# Altium integrated library Weidmueller_OMNIMATE_Signal.IntLib: 2550 symbols (part 12 of 45)
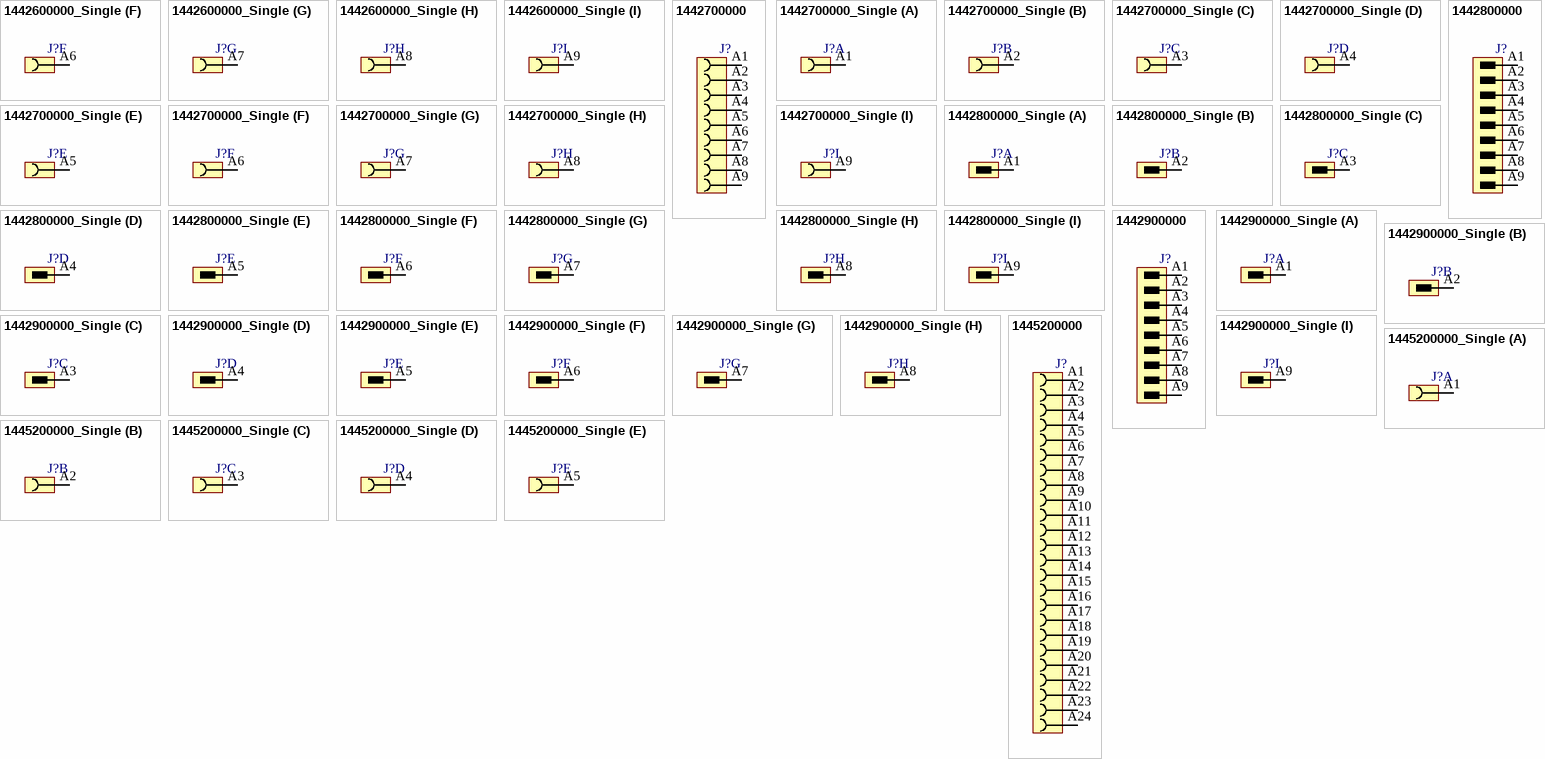
[diagram p222: symbols 1442600000_Single to 1445200000_Single]

## 1442700000
designator J?
OMNIMATE Signal - series RSV; PartNumber: 1442700000; Manufacturer: Weidmueller; Short_text_for_material: RSV1,6 LBF9 GR 3,2 SN; Pitch_mm: 5 mm; Pitch_inch: 0.197 inch; No_of_poles: 9; Solder_pin_length_mm: 3.2 mm; Contact_material: Cu-Leg; Contact_surface: tinned; Insulating_material: Wemid (PA); UL_94_flammability_rating: V-0; Rated_voltage_for_surge_voltage_class_pollution_degree_II_2: 500 V; Rated_current_min_no_of_poles_TU_20_deg_C: 32 A; PackageReference: RSV1_6_LBF_09; Colour: Pebble grey; Packaging: Box; Qty: 50 PCS; Revision: V1; ComponentLink1Description: Manufacturer URL; ComponentLink1URL: http://www.weidmueller.com/; ComponentLink2Description: URL Link1; ComponentLink2URL: http://catalog.weidmueller.com/catalog/Start.do?localeId=en&ObjectID=1442700000
footprint RSV1_6_LBF_09 (OMNIMATE Signal - Serie RSV  RSV1,6 LBF9 GR 3,2)
pins: A1, A2, A3, A4, A5, A6, A7, A8, A9

## 1442700000_Single
designator J?
OMNIMATE Signal - series RSV; PartNumber: 1442700000; Manufacturer: Weidmueller; Short_text_for_material: RSV1,6 LBF9 GR 3,2 SN; Pitch_mm: 5 mm; Pitch_inch: 0.197 inch; No_of_poles: 9; Solder_pin_length_mm: 3.2 mm; Contact_material: Cu-Leg; Contact_surface: tinned; Insulating_material: Wemid (PA); UL_94_flammability_rating: V-0; Rated_voltage_for_surge_voltage_class_pollution_degree_II_2: 500 V; Rated_current_min_no_of_poles_TU_20_deg_C: 32 A; PackageReference: RSV1_6_LBF_09; Colour: Pebble grey; Packaging: Box; Qty: 50 PCS; Revision: V1; ComponentLink1Description: Manufacturer URL; ComponentLink1URL: http://www.weidmueller.com/; ComponentLink2Description: URL Link1; ComponentLink2URL: http://catalog.weidmueller.com/catalog/Start.do?localeId=en&ObjectID=1442700000
footprint RSV1_6_LBF_09 (OMNIMATE Signal - Serie RSV  RSV1,6 LBF9 GR 3,2)
part A pins: A1
part B pins: A2
part C pins: A3
part D pins: A4
part E pins: A5
part F pins: A6
part G pins: A7
part H pins: A8
part I pins: A9

## 1442800000
designator J?
OMNIMATE Signal - series RSV; PartNumber: 1442800000; Manufacturer: Weidmueller; Short_text_for_material: RSV1,6 LSF9 GR 3,2 AU; Side_termination_characteristic: Flange; Mounting_onto_the_PCB: Solder connection; Pitch_mm: 5 mm; Pitch_inch: 0.197 inch; No_of_poles: 9; Outgoing_elbow: 180°; Solder_pin_length_mm: 3.2 mm; Contact_material: Cu-Leg; Contact_surface: Gold-plated; Insulating_material: Wemid (PA); UL_94_flammability_rating: V-0; Rated_voltage_for_surge_voltage_class_pollution_degree_II_2: 500 V; Rated_current_min_no_of_poles_TU_20_deg_C: 32 A; PackageReference: RSV1_6_LSF_09; Colour: Pebble grey; Packaging: Box; Qty: 50 PCS; Revision: V1; ComponentLink1Description: Manufacturer URL; ComponentLink1URL: http://www.weidmueller.com/; ComponentLink2Description: URL Link1; ComponentLink2URL: http://catalog.weidmueller.com/catalog/Start.do?localeId=en&ObjectID=1442800000
footprint RSV1_6_LSF_09 (OMNIMATE Signal - Serie RSV  RSV1,6 LSF9 GR 3,2)
pins: A1, A2, A3, A4, A5, A6, A7, A8, A9

## 1442800000_Single
designator J?
OMNIMATE Signal - series RSV; PartNumber: 1442800000; Manufacturer: Weidmueller; Short_text_for_material: RSV1,6 LSF9 GR 3,2 AU; Side_termination_characteristic: Flange; Mounting_onto_the_PCB: Solder connection; Pitch_mm: 5 mm; Pitch_inch: 0.197 inch; No_of_poles: 9; Outgoing_elbow: 180°; Solder_pin_length_mm: 3.2 mm; Contact_material: Cu-Leg; Contact_surface: Gold-plated; Insulating_material: Wemid (PA); UL_94_flammability_rating: V-0; Rated_voltage_for_surge_voltage_class_pollution_degree_II_2: 500 V; Rated_current_min_no_of_poles_TU_20_deg_C: 32 A; PackageReference: RSV1_6_LSF_09; Colour: Pebble grey; Packaging: Box; Qty: 50 PCS; Revision: V1; ComponentLink1Description: Manufacturer URL; ComponentLink1URL: http://www.weidmueller.com/; ComponentLink2Description: URL Link1; ComponentLink2URL: http://catalog.weidmueller.com/catalog/Start.do?localeId=en&ObjectID=1442800000
footprint RSV1_6_LSF_09 (OMNIMATE Signal - Serie RSV  RSV1,6 LSF9 GR 3,2)
part A pins: A1
part B pins: A2
part C pins: A3
part D pins: A4
part E pins: A5
part F pins: A6
part G pins: A7
part H pins: A8
part I pins: A9

## 1442900000
designator J?
OMNIMATE Signal - series RSV; PartNumber: 1442900000; Manufacturer: Weidmueller; Short_text_for_material: RSV1,6 LSF9 GR 3,2 SN; Side_termination_characteristic: Flange; Mounting_onto_the_PCB: Solder connection; Pitch_mm: 5 mm; Pitch_inch: 0.197 inch; No_of_poles: 9; Outgoing_elbow: 180°; Solder_pin_length_mm: 3.2 mm; Contact_material: Cu-Leg; Contact_surface: tinned; Insulating_material: Wemid (PA); UL_94_flammability_rating: V-0; Rated_voltage_for_surge_voltage_class_pollution_degree_II_2: 500 V; Rated_current_min_no_of_poles_TU_20_deg_C: 32 A; PackageReference: RSV1_6_LSF_09; Colour: Pebble grey; Packaging: Box; Qty: 50 PCS; Revision: V1; ComponentLink1Description: Manufacturer URL; ComponentLink1URL: http://www.weidmueller.com/; ComponentLink2Description: URL Link1; ComponentLink2URL: http://catalog.weidmueller.com/catalog/Start.do?localeId=en&ObjectID=1442900000
footprint RSV1_6_LSF_09 (OMNIMATE Signal - Serie RSV  RSV1,6 LSF9 GR 3,2)
pins: A1, A2, A3, A4, A5, A6, A7, A8, A9

## 1442900000_Single
designator J?
OMNIMATE Signal - series RSV; PartNumber: 1442900000; Manufacturer: Weidmueller; Short_text_for_material: RSV1,6 LSF9 GR 3,2 SN; Side_termination_characteristic: Flange; Mounting_onto_the_PCB: Solder connection; Pitch_mm: 5 mm; Pitch_inch: 0.197 inch; No_of_poles: 9; Outgoing_elbow: 180°; Solder_pin_length_mm: 3.2 mm; Contact_material: Cu-Leg; Contact_surface: tinned; Insulating_material: Wemid (PA); UL_94_flammability_rating: V-0; Rated_voltage_for_surge_voltage_class_pollution_degree_II_2: 500 V; Rated_current_min_no_of_poles_TU_20_deg_C: 32 A; PackageReference: RSV1_6_LSF_09; Colour: Pebble grey; Packaging: Box; Qty: 50 PCS; Revision: V1; ComponentLink1Description: Manufacturer URL; ComponentLink1URL: http://www.weidmueller.com/; ComponentLink2Description: URL Link1; ComponentLink2URL: http://catalog.weidmueller.com/catalog/Start.do?localeId=en&ObjectID=1442900000
footprint RSV1_6_LSF_09 (OMNIMATE Signal - Serie RSV  RSV1,6 LSF9 GR 3,2)
part A pins: A1
part B pins: A2
part C pins: A3
part D pins: A4
part E pins: A5
part F pins: A6
part G pins: A7
part H pins: A8
part I pins: A9

## 1445200000
designator J?
OMNIMATE Signal - series RSV; PartNumber: 1445200000; Manufacturer: Weidmueller; Short_text_for_material: RSV1,6 LB24 GR 3,2 AU; Pitch_mm: 5 mm; Pitch_inch: 0.197 inch; No_of_poles: 24; Solder_pin_length_mm: 3.2 mm; Contact_material: Cu-Leg; Contact_surface: Gold-plated; Insulating_material: Wemid (PA); UL_94_flammability_rating: V-0; Rated_voltage_for_surge_voltage_class_pollution_degree_II_2: 500 V; Rated_current_min_no_of_poles_TU_20_deg_C: 32 A; PackageReference: RSV1_6_LB_24; Colour: Pebble grey; Packaging: Box; Qty: 20 PCS; Revision: V1; ComponentLink1Description: Manufacturer URL; ComponentLink1URL: http://www.weidmueller.com/; ComponentLink2Description: URL Link1; ComponentLink2URL: http://catalog.weidmueller.com/catalog/Start.do?localeId=en&ObjectID=1445200000
footprint RSV1_6_LB_24 (OMNIMATE Signal - Serie RSV  RSV1,6 LB24 GR 3,2)
pins: A1, A2, A3, A4, A5, A6, A7, A8, A9, A10, A11, A12, A13, A14, A15, A16, A17, A18, A19, A20, A21, A22, A23, A24

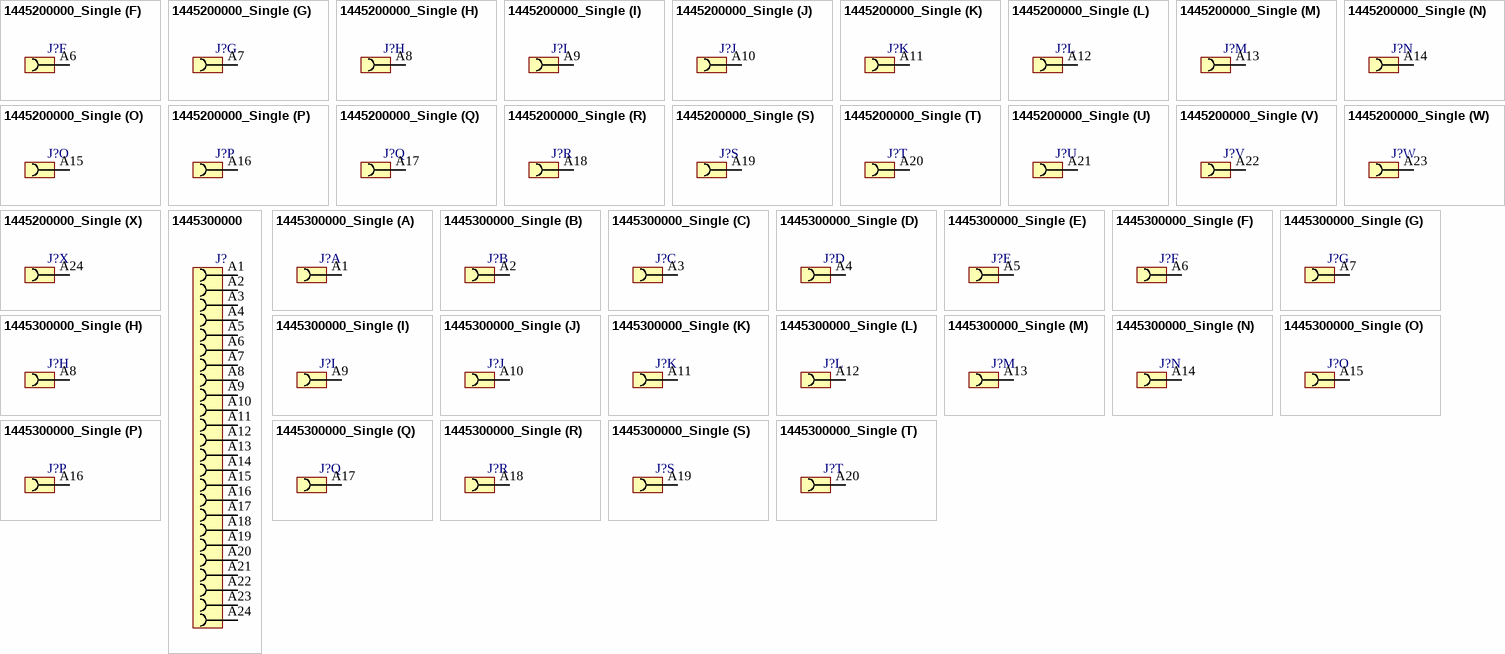
[diagram p67: symbols 1445200000_Single to 1445300000_Single]

## 1445200000_Single
designator J?
OMNIMATE Signal - series RSV; PartNumber: 1445200000; Manufacturer: Weidmueller; Short_text_for_material: RSV1,6 LB24 GR 3,2 AU; Pitch_mm: 5 mm; Pitch_inch: 0.197 inch; No_of_poles: 24; Solder_pin_length_mm: 3.2 mm; Contact_material: Cu-Leg; Contact_surface: Gold-plated; Insulating_material: Wemid (PA); UL_94_flammability_rating: V-0; Rated_voltage_for_surge_voltage_class_pollution_degree_II_2: 500 V; Rated_current_min_no_of_poles_TU_20_deg_C: 32 A; PackageReference: RSV1_6_LB_24; Colour: Pebble grey; Packaging: Box; Qty: 20 PCS; Revision: V1; ComponentLink1Description: Manufacturer URL; ComponentLink1URL: http://www.weidmueller.com/; ComponentLink2Description: URL Link1; ComponentLink2URL: http://catalog.weidmueller.com/catalog/Start.do?localeId=en&ObjectID=1445200000
footprint RSV1_6_LB_24 (OMNIMATE Signal - Serie RSV  RSV1,6 LB24 GR 3,2)
part A pins: A1
part B pins: A2
part C pins: A3
part D pins: A4
part E pins: A5
part F pins: A6
part G pins: A7
part H pins: A8
part I pins: A9
part J pins: A10
part K pins: A11
part L pins: A12
part M pins: A13
part N pins: A14
part O pins: A15
part P pins: A16
part Q pins: A17
part R pins: A18
part S pins: A19
part T pins: A20
part U pins: A21
part V pins: A22
part W pins: A23
part X pins: A24

## 1445300000
designator J?
OMNIMATE Signal - series RSV; PartNumber: 1445300000; Manufacturer: Weidmueller; Short_text_for_material: RSV1,6 LB24 GR 3,2 SN; Pitch_mm: 5 mm; Pitch_inch: 0.197 inch; No_of_poles: 24; Solder_pin_length_mm: 3.2 mm; Contact_material: Cu-Leg; Contact_surface: tinned; Insulating_material: Wemid (PA); UL_94_flammability_rating: V-0; Rated_voltage_for_surge_voltage_class_pollution_degree_II_2: 500 V; Rated_current_min_no_of_poles_TU_20_deg_C: 32 A; PackageReference: RSV1_6_LB_24; Colour: Pebble grey; Packaging: Box; Qty: 20 PCS; Revision: V1; ComponentLink1Description: Manufacturer URL; ComponentLink1URL: http://www.weidmueller.com/; ComponentLink2Description: URL Link1; ComponentLink2URL: http://catalog.weidmueller.com/catalog/Start.do?localeId=en&ObjectID=1445300000
footprint RSV1_6_LB_24 (OMNIMATE Signal - Serie RSV  RSV1,6 LB24 GR 3,2)
pins: A1, A2, A3, A4, A5, A6, A7, A8, A9, A10, A11, A12, A13, A14, A15, A16, A17, A18, A19, A20, A21, A22, A23, A24

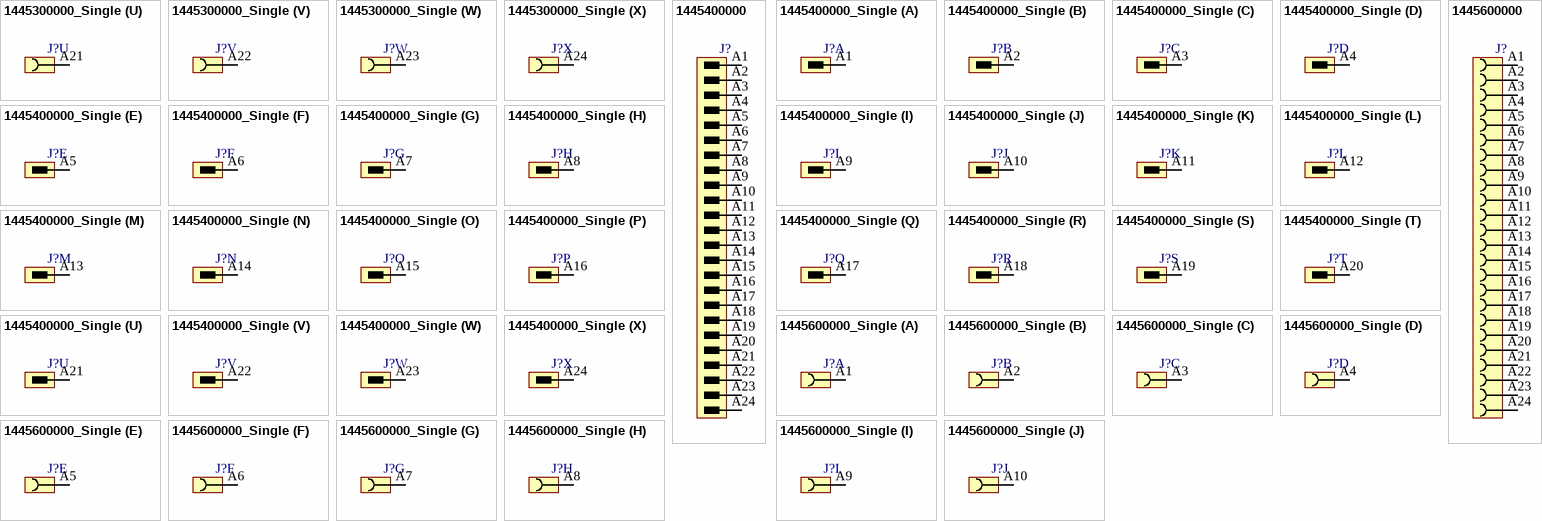
[diagram p68: symbols 1445300000_Single to 1445600000_Single]

## 1445300000_Single
designator J?
OMNIMATE Signal - series RSV; PartNumber: 1445300000; Manufacturer: Weidmueller; Short_text_for_material: RSV1,6 LB24 GR 3,2 SN; Pitch_mm: 5 mm; Pitch_inch: 0.197 inch; No_of_poles: 24; Solder_pin_length_mm: 3.2 mm; Contact_material: Cu-Leg; Contact_surface: tinned; Insulating_material: Wemid (PA); UL_94_flammability_rating: V-0; Rated_voltage_for_surge_voltage_class_pollution_degree_II_2: 500 V; Rated_current_min_no_of_poles_TU_20_deg_C: 32 A; PackageReference: RSV1_6_LB_24; Colour: Pebble grey; Packaging: Box; Qty: 20 PCS; Revision: V1; ComponentLink1Description: Manufacturer URL; ComponentLink1URL: http://www.weidmueller.com/; ComponentLink2Description: URL Link1; ComponentLink2URL: http://catalog.weidmueller.com/catalog/Start.do?localeId=en&ObjectID=1445300000
footprint RSV1_6_LB_24 (OMNIMATE Signal - Serie RSV  RSV1,6 LB24 GR 3,2)
part A pins: A1
part B pins: A2
part C pins: A3
part D pins: A4
part E pins: A5
part F pins: A6
part G pins: A7
part H pins: A8
part I pins: A9
part J pins: A10
part K pins: A11
part L pins: A12
part M pins: A13
part N pins: A14
part O pins: A15
part P pins: A16
part Q pins: A17
part R pins: A18
part S pins: A19
part T pins: A20
part U pins: A21
part V pins: A22
part W pins: A23
part X pins: A24

## 1445400000
designator J?
OMNIMATE Signal - series RSV; PartNumber: 1445400000; Manufacturer: Weidmueller; Short_text_for_material: RSV1,6 LS24 GR 3,2 AU; Side_termination_characteristic: closed side; Mounting_onto_the_PCB: Solder connection; Pitch_mm: 5 mm; Pitch_inch: 0.197 inch; No_of_poles: 24; Outgoing_elbow: 180°; Solder_pin_length_mm: 3.2 mm; Contact_material: Cu-Leg; Contact_surface: Gold-plated; Insulating_material: Wemid (PA); UL_94_flammability_rating: V-0; Rated_voltage_for_surge_voltage_class_pollution_degree_II_2: 500 V; Rated_current_min_no_of_poles_TU_20_deg_C: 32 A; PackageReference: RSV1_6_LS_24; Colour: Pebble grey; Packaging: Box; Qty: 20 PCS; Revision: V1; ComponentLink1Description: Manufacturer URL; ComponentLink1URL: http://www.weidmueller.com/; ComponentLink2Description: URL Link1; ComponentLink2URL: http://catalog.weidmueller.com/catalog/Start.do?localeId=en&ObjectID=1445400000
footprint RSV1_6_LS_24 (OMNIMATE Signal - Serie RSV  RSV1,6 LS24)
pins: A1, A2, A3, A4, A5, A6, A7, A8, A9, A10, A11, A12, A13, A14, A15, A16, A17, A18, A19, A20, A21, A22, A23, A24

## 1445400000_Single
designator J?
OMNIMATE Signal - series RSV; PartNumber: 1445400000; Manufacturer: Weidmueller; Short_text_for_material: RSV1,6 LS24 GR 3,2 AU; Side_termination_characteristic: closed side; Mounting_onto_the_PCB: Solder connection; Pitch_mm: 5 mm; Pitch_inch: 0.197 inch; No_of_poles: 24; Outgoing_elbow: 180°; Solder_pin_length_mm: 3.2 mm; Contact_material: Cu-Leg; Contact_surface: Gold-plated; Insulating_material: Wemid (PA); UL_94_flammability_rating: V-0; Rated_voltage_for_surge_voltage_class_pollution_degree_II_2: 500 V; Rated_current_min_no_of_poles_TU_20_deg_C: 32 A; PackageReference: RSV1_6_LS_24; Colour: Pebble grey; Packaging: Box; Qty: 20 PCS; Revision: V1; ComponentLink1Description: Manufacturer URL; ComponentLink1URL: http://www.weidmueller.com/; ComponentLink2Description: URL Link1; ComponentLink2URL: http://catalog.weidmueller.com/catalog/Start.do?localeId=en&ObjectID=1445400000
footprint RSV1_6_LS_24 (OMNIMATE Signal - Serie RSV  RSV1,6 LS24)
part A pins: A1
part B pins: A2
part C pins: A3
part D pins: A4
part E pins: A5
part F pins: A6
part G pins: A7
part H pins: A8
part I pins: A9
part J pins: A10
part K pins: A11
part L pins: A12
part M pins: A13
part N pins: A14
part O pins: A15
part P pins: A16
part Q pins: A17
part R pins: A18
part S pins: A19
part T pins: A20
part U pins: A21
part V pins: A22
part W pins: A23
part X pins: A24

## 1445600000
designator J?
OMNIMATE Signal - series RSV; PartNumber: 1445600000; Manufacturer: Weidmueller; Short_text_for_material: RSV1,6 LBF24 GR 3,2 AU; Pitch_mm: 5 mm; Pitch_inch: 0.197 inch; No_of_poles: 24; Solder_pin_length_mm: 3.2 mm; Contact_material: Cu-Leg; Contact_surface: Gold-plated; Insulating_material: Wemid (PA); UL_94_flammability_rating: V-0; Rated_voltage_for_surge_voltage_class_pollution_degree_II_2: 500 V; Rated_current_min_no_of_poles_TU_20_deg_C: 32 A; PackageReference: RSV1_6_LBF_24; Colour: Pebble grey; Packaging: Box; Qty: 20 PCS; Revision: V1; ComponentLink1Description: Manufacturer URL; ComponentLink1URL: http://www.weidmueller.com/; ComponentLink2Description: URL Link1; ComponentLink2URL: http://catalog.weidmueller.com/catalog/Start.do?localeId=en&ObjectID=1445600000
footprint RSV1_6_LBF_24 (OMNIMATE Signal - Serie RSV  RSV1,6 LBF24 GR 3,2)
pins: A1, A2, A3, A4, A5, A6, A7, A8, A9, A10, A11, A12, A13, A14, A15, A16, A17, A18, A19, A20, A21, A22, A23, A24

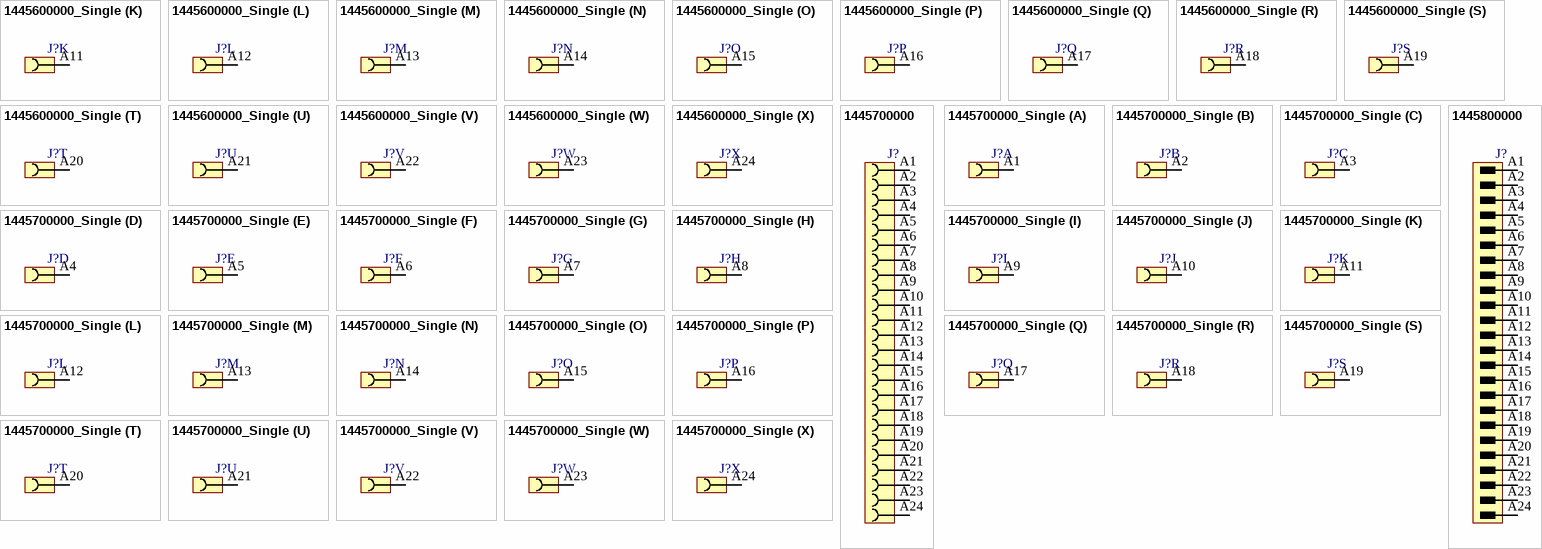
[diagram p69: symbols 1445600000_Single to 1445800000]

## 1445600000_Single
designator J?
OMNIMATE Signal - series RSV; PartNumber: 1445600000; Manufacturer: Weidmueller; Short_text_for_material: RSV1,6 LBF24 GR 3,2 AU; Pitch_mm: 5 mm; Pitch_inch: 0.197 inch; No_of_poles: 24; Solder_pin_length_mm: 3.2 mm; Contact_material: Cu-Leg; Contact_surface: Gold-plated; Insulating_material: Wemid (PA); UL_94_flammability_rating: V-0; Rated_voltage_for_surge_voltage_class_pollution_degree_II_2: 500 V; Rated_current_min_no_of_poles_TU_20_deg_C: 32 A; PackageReference: RSV1_6_LBF_24; Colour: Pebble grey; Packaging: Box; Qty: 20 PCS; Revision: V1; ComponentLink1Description: Manufacturer URL; ComponentLink1URL: http://www.weidmueller.com/; ComponentLink2Description: URL Link1; ComponentLink2URL: http://catalog.weidmueller.com/catalog/Start.do?localeId=en&ObjectID=1445600000
footprint RSV1_6_LBF_24 (OMNIMATE Signal - Serie RSV  RSV1,6 LBF24 GR 3,2)
part A pins: A1
part B pins: A2
part C pins: A3
part D pins: A4
part E pins: A5
part F pins: A6
part G pins: A7
part H pins: A8
part I pins: A9
part J pins: A10
part K pins: A11
part L pins: A12
part M pins: A13
part N pins: A14
part O pins: A15
part P pins: A16
part Q pins: A17
part R pins: A18
part S pins: A19
part T pins: A20
part U pins: A21
part V pins: A22
part W pins: A23
part X pins: A24

## 1445700000
designator J?
OMNIMATE Signal - series RSV; PartNumber: 1445700000; Manufacturer: Weidmueller; Short_text_for_material: RSV1,6 LBF24 GR 3,2 SN; Pitch_mm: 5 mm; Pitch_inch: 0.197 inch; No_of_poles: 24; Solder_pin_length_mm: 3.2 mm; Contact_material: Cu-Leg; Contact_surface: tinned; Insulating_material: Wemid (PA); UL_94_flammability_rating: V-0; Rated_voltage_for_surge_voltage_class_pollution_degree_II_2: 500 V; Rated_current_min_no_of_poles_TU_20_deg_C: 32 A; PackageReference: RSV1_6_LBF_24; Colour: Pebble grey; Packaging: Box; Qty: 20 PCS; Revision: V1; ComponentLink1Description: Manufacturer URL; ComponentLink1URL: http://www.weidmueller.com/; ComponentLink2Description: URL Link1; ComponentLink2URL: http://catalog.weidmueller.com/catalog/Start.do?localeId=en&ObjectID=1445700000
footprint RSV1_6_LBF_24 (OMNIMATE Signal - Serie RSV  RSV1,6 LBF24 GR 3,2)
pins: A1, A2, A3, A4, A5, A6, A7, A8, A9, A10, A11, A12, A13, A14, A15, A16, A17, A18, A19, A20, A21, A22, A23, A24

## 1445700000_Single
designator J?
OMNIMATE Signal - series RSV; PartNumber: 1445700000; Manufacturer: Weidmueller; Short_text_for_material: RSV1,6 LBF24 GR 3,2 SN; Pitch_mm: 5 mm; Pitch_inch: 0.197 inch; No_of_poles: 24; Solder_pin_length_mm: 3.2 mm; Contact_material: Cu-Leg; Contact_surface: tinned; Insulating_material: Wemid (PA); UL_94_flammability_rating: V-0; Rated_voltage_for_surge_voltage_class_pollution_degree_II_2: 500 V; Rated_current_min_no_of_poles_TU_20_deg_C: 32 A; PackageReference: RSV1_6_LBF_24; Colour: Pebble grey; Packaging: Box; Qty: 20 PCS; Revision: V1; ComponentLink1Description: Manufacturer URL; ComponentLink1URL: http://www.weidmueller.com/; ComponentLink2Description: URL Link1; ComponentLink2URL: http://catalog.weidmueller.com/catalog/Start.do?localeId=en&ObjectID=1445700000
footprint RSV1_6_LBF_24 (OMNIMATE Signal - Serie RSV  RSV1,6 LBF24 GR 3,2)
part A pins: A1
part B pins: A2
part C pins: A3
part D pins: A4
part E pins: A5
part F pins: A6
part G pins: A7
part H pins: A8
part I pins: A9
part J pins: A10
part K pins: A11
part L pins: A12
part M pins: A13
part N pins: A14
part O pins: A15
part P pins: A16
part Q pins: A17
part R pins: A18
part S pins: A19
part T pins: A20
part U pins: A21
part V pins: A22
part W pins: A23
part X pins: A24

## 1445800000
designator J?
OMNIMATE Signal - series RSV; PartNumber: 1445800000; Manufacturer: Weidmueller; Short_text_for_material: RSV1,6 LSF24 GR 3,2 AU; Side_termination_characteristic: Flange; Mounting_onto_the_PCB: Solder connection; Pitch_mm: 5 mm; Pitch_inch: 0.197 inch; No_of_poles: 24; Outgoing_elbow: 180°; Solder_pin_length_mm: 3.2 mm; Contact_material: Cu-Leg; Contact_surface: Gold-plated; Insulating_material: Wemid (PA); UL_94_flammability_rating: V-0; Rated_voltage_for_surge_voltage_class_pollution_degree_II_2: 500 V; Rated_current_min_no_of_poles_TU_20_deg_C: 32 A; PackageReference: RSV1_6_LSF_24; Colour: Pebble grey; Packaging: Box; Qty: 20 PCS; Revision: V1; ComponentLink1Description: Manufacturer URL; ComponentLink1URL: http://www.weidmueller.com/; ComponentLink2Description: URL Link1; ComponentLink2URL: http://catalog.weidmueller.com/catalog/Start.do?localeId=en&ObjectID=1445800000
footprint RSV1_6_LSF_24 (OMNIMATE Signal - Serie RSV  RSV1,6 LSF24)
pins: A1, A2, A3, A4, A5, A6, A7, A8, A9, A10, A11, A12, A13, A14, A15, A16, A17, A18, A19, A20, A21, A22, A23, A24

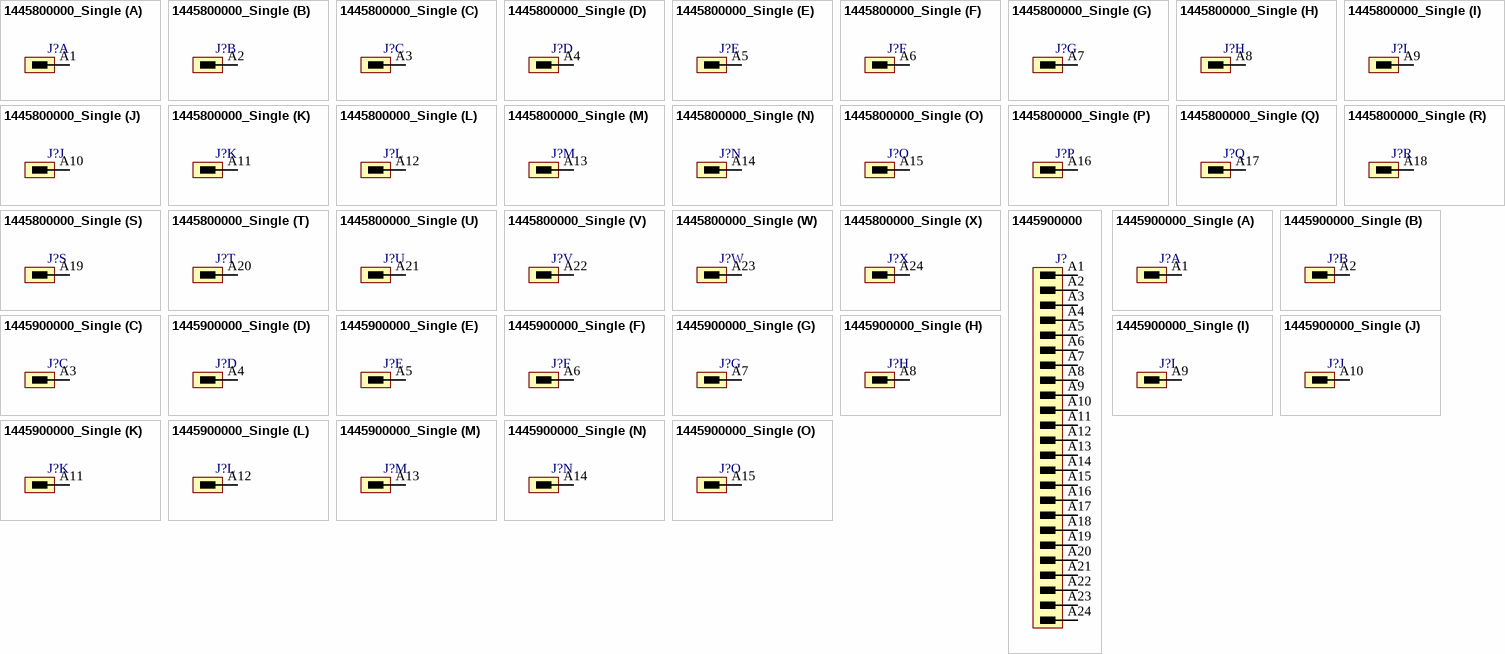
[diagram p70: symbols 1445800000_Single to 1445900000_Single]

## 1445800000_Single
designator J?
OMNIMATE Signal - series RSV; PartNumber: 1445800000; Manufacturer: Weidmueller; Short_text_for_material: RSV1,6 LSF24 GR 3,2 AU; Side_termination_characteristic: Flange; Mounting_onto_the_PCB: Solder connection; Pitch_mm: 5 mm; Pitch_inch: 0.197 inch; No_of_poles: 24; Outgoing_elbow: 180°; Solder_pin_length_mm: 3.2 mm; Contact_material: Cu-Leg; Contact_surface: Gold-plated; Insulating_material: Wemid (PA); UL_94_flammability_rating: V-0; Rated_voltage_for_surge_voltage_class_pollution_degree_II_2: 500 V; Rated_current_min_no_of_poles_TU_20_deg_C: 32 A; PackageReference: RSV1_6_LSF_24; Colour: Pebble grey; Packaging: Box; Qty: 20 PCS; Revision: V1; ComponentLink1Description: Manufacturer URL; ComponentLink1URL: http://www.weidmueller.com/; ComponentLink2Description: URL Link1; ComponentLink2URL: http://catalog.weidmueller.com/catalog/Start.do?localeId=en&ObjectID=1445800000
footprint RSV1_6_LSF_24 (OMNIMATE Signal - Serie RSV  RSV1,6 LSF24)
part A pins: A1
part B pins: A2
part C pins: A3
part D pins: A4
part E pins: A5
part F pins: A6
part G pins: A7
part H pins: A8
part I pins: A9
part J pins: A10
part K pins: A11
part L pins: A12
part M pins: A13
part N pins: A14
part O pins: A15
part P pins: A16
part Q pins: A17
part R pins: A18
part S pins: A19
part T pins: A20
part U pins: A21
part V pins: A22
part W pins: A23
part X pins: A24

## 1445900000
designator J?
OMNIMATE Signal - series RSV; PartNumber: 1445900000; Manufacturer: Weidmueller; Short_text_for_material: RSV1,6 LSF24 GR 3,2 SN; Side_termination_characteristic: Flange; Mounting_onto_the_PCB: Solder connection; Pitch_mm: 5 mm; Pitch_inch: 0.197 inch; No_of_poles: 24; Outgoing_elbow: 180°; Solder_pin_length_mm: 3.2 mm; Contact_material: Cu-Leg; Contact_surface: tinned; Insulating_material: Wemid (PA); UL_94_flammability_rating: V-0; Rated_voltage_for_surge_voltage_class_pollution_degree_II_2: 500 V; Rated_current_min_no_of_poles_TU_20_deg_C: 32 A; PackageReference: RSV1_6_LSF_24; Colour: Pebble grey; Packaging: Box; Qty: 20 PCS; Revision: V1; ComponentLink1Description: Manufacturer URL; ComponentLink1URL: http://www.weidmueller.com/; ComponentLink2Description: URL Link1; ComponentLink2URL: http://catalog.weidmueller.com/catalog/Start.do?localeId=en&ObjectID=1445900000
footprint RSV1_6_LSF_24 (OMNIMATE Signal - Serie RSV  RSV1,6 LSF24)
pins: A1, A2, A3, A4, A5, A6, A7, A8, A9, A10, A11, A12, A13, A14, A15, A16, A17, A18, A19, A20, A21, A22, A23, A24

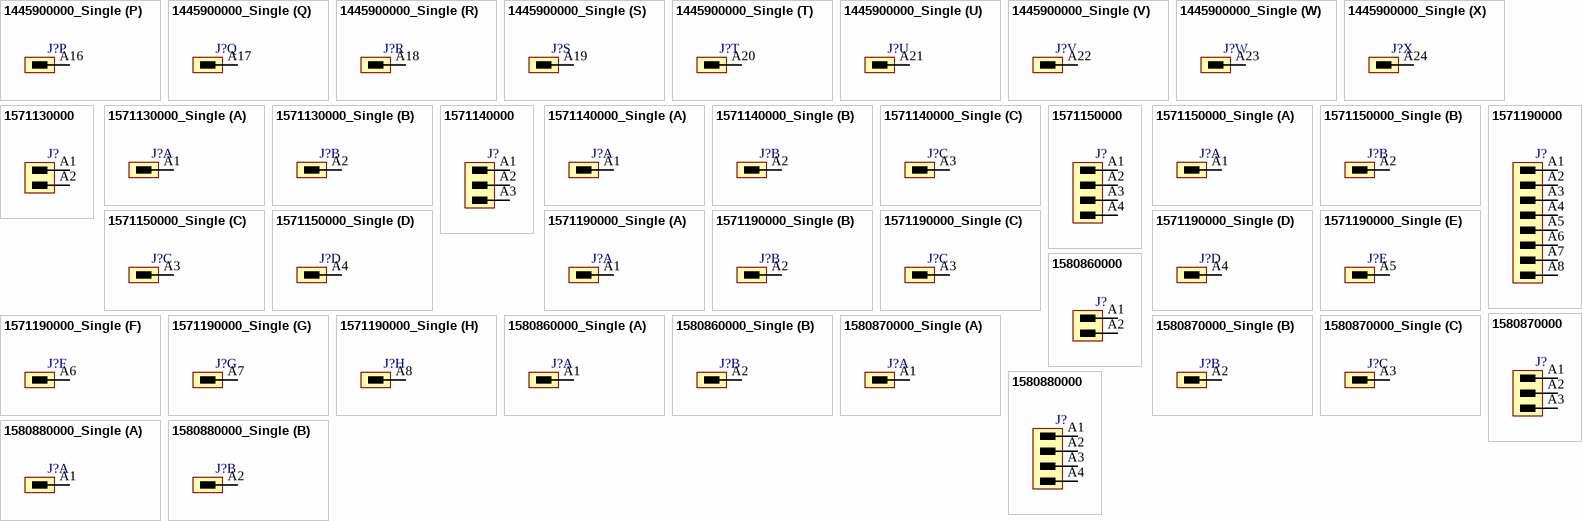
[diagram p71: symbols 1445900000_Single to 1580880000_Single]

## 1445900000_Single
designator J?
OMNIMATE Signal - series RSV; PartNumber: 1445900000; Manufacturer: Weidmueller; Short_text_for_material: RSV1,6 LSF24 GR 3,2 SN; Side_termination_characteristic: Flange; Mounting_onto_the_PCB: Solder connection; Pitch_mm: 5 mm; Pitch_inch: 0.197 inch; No_of_poles: 24; Outgoing_elbow: 180°; Solder_pin_length_mm: 3.2 mm; Contact_material: Cu-Leg; Contact_surface: tinned; Insulating_material: Wemid (PA); UL_94_flammability_rating: V-0; Rated_voltage_for_surge_voltage_class_pollution_degree_II_2: 500 V; Rated_current_min_no_of_poles_TU_20_deg_C: 32 A; PackageReference: RSV1_6_LSF_24; Colour: Pebble grey; Packaging: Box; Qty: 20 PCS; Revision: V1; ComponentLink1Description: Manufacturer URL; ComponentLink1URL: http://www.weidmueller.com/; ComponentLink2Description: URL Link1; ComponentLink2URL: http://catalog.weidmueller.com/catalog/Start.do?localeId=en&ObjectID=1445900000
footprint RSV1_6_LSF_24 (OMNIMATE Signal - Serie RSV  RSV1,6 LSF24)
part A pins: A1
part B pins: A2
part C pins: A3
part D pins: A4
part E pins: A5
part F pins: A6
part G pins: A7
part H pins: A8
part I pins: A9
part J pins: A10
part K pins: A11
part L pins: A12
part M pins: A13
part N pins: A14
part O pins: A15
part P pins: A16
part Q pins: A17
part R pins: A18
part S pins: A19
part T pins: A20
part U pins: A21
part V pins: A22
part W pins: A23
part X pins: A24

## 1571130000
designator J?
OMNIMATE Signal - series BL/SL 5.00; PartNumber: 1571130000; Manufacturer: Weidmueller; Short_text_for_material: SL 5.00/02/90 3.2SN OR BX; Side_termination_characteristic: open side; Mounting_onto_the_PCB: Solder connection; Pitch_mm: 5 mm; Pitch_inch: 0.197 inch; No_of_poles: 2; Outgoing_elbow: 90°; Solder_pin_length_mm: 3.2 mm; Contact_material: CuSn; Contact_surface: tinned; Insulating_material: PBT; UL_94_flammability_rating: V-0; Rated_voltage_for_surge_voltage_class_pollution_degree_II_2: 400 V; Rated_current_min_no_of_poles_TU_20_deg_C: 32 A; Rated_voltage_use_group_B_UL_1059: 300 V; Rated_current_use_group_B_UL_1059: 15 A; PackageReference: SL_5_00_90_02; Colour: Orange; Packaging: Box; Qty: 100 PCS; Revision: V1; ComponentLink1Description: Manufacturer URL; ComponentLink1URL: http://www.weidmueller.com/; ComponentLink2Description: URL Link1; ComponentLink2URL: http://catalog.weidmueller.com/catalog/Start.do?localeId=en&ObjectID=1571130000
footprint SL_5_00_90_02 (OMNIMATE Signal - Serie BL/SL 5.00  SL 5.00/02/90 3.2)
pins: A1, A2

## 1571130000_Single
designator J?
OMNIMATE Signal - series BL/SL 5.00; PartNumber: 1571130000; Manufacturer: Weidmueller; Short_text_for_material: SL 5.00/02/90 3.2SN OR BX; Side_termination_characteristic: open side; Mounting_onto_the_PCB: Solder connection; Pitch_mm: 5 mm; Pitch_inch: 0.197 inch; No_of_poles: 2; Outgoing_elbow: 90°; Solder_pin_length_mm: 3.2 mm; Contact_material: CuSn; Contact_surface: tinned; Insulating_material: PBT; UL_94_flammability_rating: V-0; Rated_voltage_for_surge_voltage_class_pollution_degree_II_2: 400 V; Rated_current_min_no_of_poles_TU_20_deg_C: 32 A; Rated_voltage_use_group_B_UL_1059: 300 V; Rated_current_use_group_B_UL_1059: 15 A; PackageReference: SL_5_00_90_02; Colour: Orange; Packaging: Box; Qty: 100 PCS; Revision: V1; ComponentLink1Description: Manufacturer URL; ComponentLink1URL: http://www.weidmueller.com/; ComponentLink2Description: URL Link1; ComponentLink2URL: http://catalog.weidmueller.com/catalog/Start.do?localeId=en&ObjectID=1571130000
footprint SL_5_00_90_02 (OMNIMATE Signal - Serie BL/SL 5.00  SL 5.00/02/90 3.2)
part A pins: A1
part B pins: A2

## 1571140000
designator J?
OMNIMATE Signal - series BL/SL 5.00; PartNumber: 1571140000; Manufacturer: Weidmueller; Short_text_for_material: SL 5.00/03/90 3.2SN OR BX; Side_termination_characteristic: open side; Mounting_onto_the_PCB: Solder connection; Pitch_mm: 5 mm; Pitch_inch: 0.197 inch; No_of_poles: 3; Outgoing_elbow: 90°; Solder_pin_length_mm: 3.2 mm; Contact_material: CuSn; Contact_surface: tinned; Insulating_material: PBT; UL_94_flammability_rating: V-0; Rated_voltage_for_surge_voltage_class_pollution_degree_II_2: 400 V; Rated_current_min_no_of_poles_TU_20_deg_C: 32 A; Rated_voltage_use_group_B_UL_1059: 300 V; Rated_current_use_group_B_UL_1059: 15 A; PackageReference: SL_5_00_90_03; Colour: Orange; Packaging: Box; Qty: 100 PCS; Revision: V1; ComponentLink1Description: Manufacturer URL; ComponentLink1URL: http://www.weidmueller.com/; ComponentLink2Description: URL Link1; ComponentLink2URL: http://catalog.weidmueller.com/catalog/Start.do?localeId=en&ObjectID=1571140000
footprint SL_5_00_90_03 (OMNIMATE Signal - Serie BL/SL 5.00  SL 5.00/03/90 3.2)
pins: A1, A2, A3

## 1571140000_Single
designator J?